# Altium footprint library pcb2D3D库101.PcbLib: 411 footprints (part 16 of 26)
Each footprint in its own frame and in the unit in brackets; x right, y up, seen from the top. Pads: shape width x height; smd on the part's side, far side on the other; paste and mask are expansions set on the pad; w line width, h text height; cw(c..) or ccw(c..) is an arc to the next point about the centre after c.
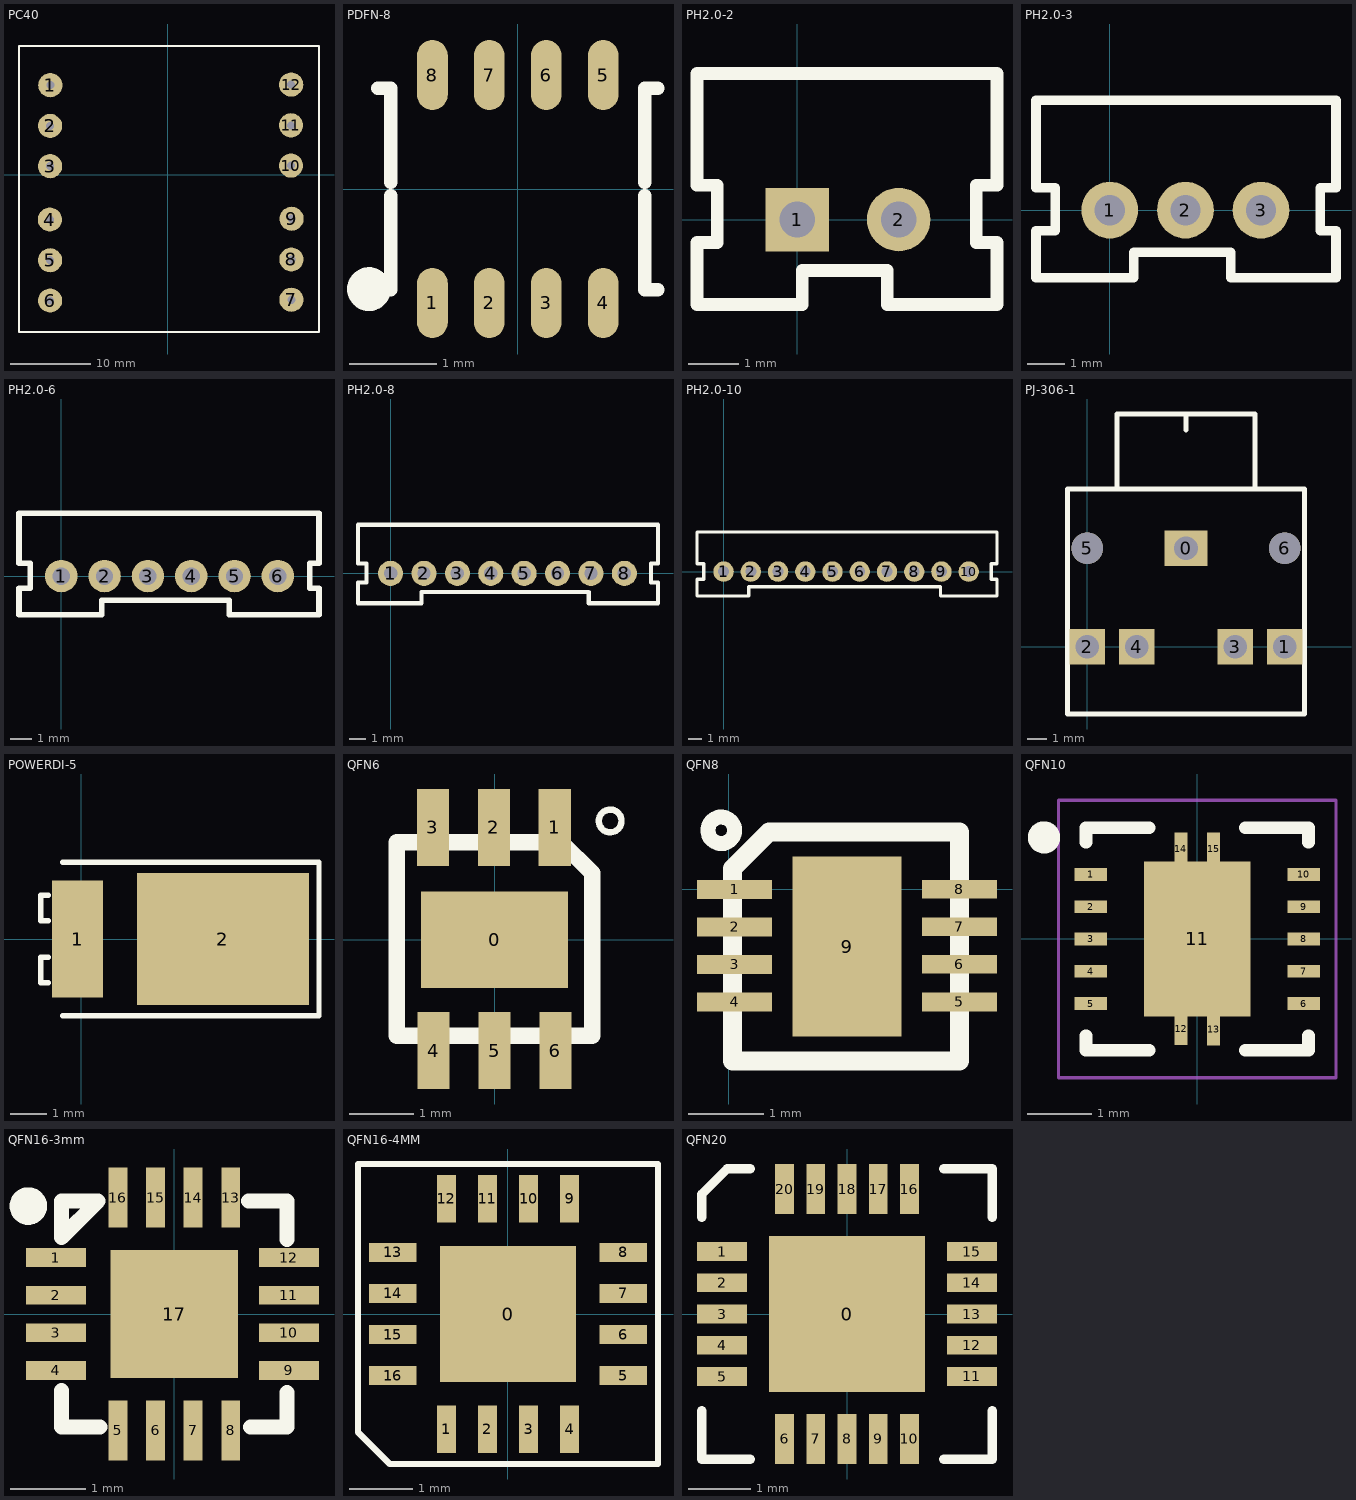
[diagram p15: the footprints below, top view; thin cyan lines are the x and y axes]

## PC40 [mm]
pads (12):
  round 3 hole 1: 1(-14.605,11.151) 2(-14.63,6.096) 3(-14.63,1.092) 4(-14.656,-5.537) 5(-14.63,-10.592) 6(-14.63,-15.596) 7(15.342,-15.494) 8(15.342,-10.49) 9(15.367,-5.436) 10(15.291,1.168) 11(15.291,6.172) 12(15.316,11.227)
TopOverlay:
  lines w0.254: -18.491,-19.482 -18.491,16.002 18.771,16.002 18.771,-19.482 -18.491,-19.482
3D body: height 15, standoff -5, extent 14.324,10.229 16.316,12.225
3D body: height 15, standoff -5, extent 14.299,5.174 16.291,7.17
3D body: height 15, standoff -5, extent 14.299,0.171 16.291,2.167
3D body: height 15, standoff -5, extent 14.375,-6.433 16.367,-4.437
3D body: height 15, standoff -5, extent 14.35,-11.488 16.342,-9.492
3D body: height 15, standoff -5, extent 14.35,-16.492 16.342,-14.496
3D body: height 15, standoff -5, extent -15.622,-16.593 -13.63,-14.597
3D body: height 15, standoff -5, extent -15.622,-11.59 -13.63,-9.594
3D body: height 15, standoff -5, extent -15.652,-6.477 -13.66,-4.481
3D body: height 15, standoff -5, extent -15.622,0.094 -13.63,2.09
3D body: height 15, standoff -5, extent -15.622,5.098 -13.63,7.094
3D body: height 15, standoff -5, extent -15.597,10.153 -13.605,12.149
3D body: height 30, standoff 5, extent -18.491,-19.482 18.771,16.002

## PCBComponent_1 - duplicate [mm]

## PDFN-8 [mm]
height 0.9
pads (8):
  oval 0.35x0.8 smd: 1(-0.975,-1.3) 2(-0.325,-1.3) 3(0.325,-1.3) 4(0.975,-1.3) 5(0.975,1.3) 6(0.325,1.3) 7(-0.325,1.3) 8(-0.975,1.3)
TopOverlay:
  circle w0.25: c-1.7,-1.143 r0.125
  lines w0.152: -1.6,1.15 -1.45,1.15 -1.45,0.075 ; -1.45,-1.15 -1.45,-0.075 ; 1.45,-0.075 1.45,-1.15 1.6,-1.15 ; 1.45,0.075 1.45,1.15 1.6,1.15
3D body "PDFN-8.STEP": height 0.9, standoff 0, extent -1.549,-1.4 1.551,1.4

## PH2.0-2 [mil]
pads (2):
  rect 50x50 hole 28: 1(0,0)
  round 50 hole 28: 2(80,0)
TopOverlay:
  lines w10: -78.8,-66.93 -78.8,-18.06 -62.82,-18.06 -62.82,26.94 -78.8,26.94 -78.8,115 157.42,115 157.42,26.94 141,26.94 141,-18.06 157.42,-18.06 157.42,-66.93 71,-66.93 71,-40.19 4,-40.19 4,-66.93 -78.8,-66.93
3D body "PH2.step": height 236.22, standoff -133.86, extent -76.13,-65.57 156.15,111.59

## PH2.0-3 [mm]
pads (3):
  round 1.5 hole 0.8: 1(0,0) 2(2,0) 3(4,0)
TopOverlay:
  lines w0.254: -1.952,-1.791 -1.952,-0.55 -1.444,-0.55 -1.444,0.593 -1.952,0.593 -1.952,2.909 5.983,2.909 5.983,0.593 5.566,0.593 5.566,-0.55 5.983,-0.55 5.983,-1.791 3.2,-1.791 3.2,-1.112 0.635,-1.112 0.635,-1.791 -1.952,-1.791
3D body "PH3.step": height 6, standoff -3.4, extent -1.943,-1.681 5.957,2.819

## PH2.0-6 [mm]
pads (6):
  round 1.5 hole 0.8: 1(0,0) 2(2,0) 3(4,0) 4(6,0) 5(8,0) 6(10,0)
TopOverlay:
  lines w0.254: -1.952,-1.791 -1.952,-0.55 -1.444,-0.55 -1.444,0.593 -1.952,0.593 -1.952,2.909 11.902,2.909 11.902,0.593 11.485,0.593 11.485,-0.55 11.902,-0.55 11.902,-1.791 7.751,-1.791 7.751,-1.112 3.509,-1.112 1.858,-1.112 1.858,-1.791 -1.952,-1.791
3D body "PH6.step": height 6, standoff -3, extent -1.946,-1.702 11.954,2.798

## PH2.0-8 [mm]
pads (8):
  round 1.5 hole 0.8: 1(0,0) 2(2,0) 3(4,0) 4(6,0) 5(8,0) 6(10,0) 7(12,0) 8(14,0)
TopOverlay:
  lines w0.254: -1.952,-1.791 1.858,-1.791 1.858,-1.112 3.509,-1.112 11.866,-1.112 11.866,-1.791 16.016,-1.791 16.016,-0.55 15.599,-0.55 15.599,0.593 16.016,0.593 16.016,2.909 -1.952,2.909 -1.952,0.593 -1.444,0.593 -1.444,-0.55 -1.952,-0.55 -1.952,-1.791
3D body "PH8.step": height 6, standoff -3, extent -1.94,-1.676 15.96,2.824

## PH2.0-10 [mm]
pads (10):
  round 1.5 hole 0.8: 1(0,0) 2(2,0) 3(4,0) 4(6,0) 5(8,0) 6(10,0) 7(12,0) 8(14,0) 9(16,0) 10(18,0)
TopOverlay:
  lines w0.254: -1.952,-1.791 1.858,-1.791 1.858,-1.112 3.509,-1.112 15.93,-1.112 15.93,-1.791 20.08,-1.791 20.08,-0.55 19.663,-0.55 19.663,0.593 20.08,0.593 20.08,2.909 -1.952,2.909 -1.952,0.593 -1.444,0.593 -1.444,-0.55 -1.952,-0.55 -1.952,-1.791
3D body "PH10.step": height 6, standoff -3, extent -1.952,-1.695 19.948,2.805

## PJ-306-1 [mm]
pads (7):
  rect 2.2x1.8 hole 1.2: 0(5,5)
  rect 1.8x1.8 hole 1.2: 1(10,0) 2(0,0) 3(7.5,0) 4(2.5,0)
  round 1.6 hole 1.6 unplated: 5(0,5) 6(10,5)
TopOverlay:
  lines w0.254: 1.5,8 1.5,11.8 8.4,11.8 ; 5,11 5,11.8 ; 8.5,8 8.5,11.8 ; -1,-3.4 11,-3.4 11,8 -1,8 -1,-3.4
3D body "耳机.ST": height 3.2, standoff -10.8, extent -1.041,-3.689 11.059,11.411

## POWERDI-5 [mm]
pads (2):
  rect 1.4x3.2 smd: 1(-0.1,0)
  rect 4.7x3.6 smd: 2(3.87,0)
TopOverlay:
  lines w0.15: -0.9,-1.2 -1.1,-1.2 -1.1,-0.5 -0.9,-0.5 ; -0.9,0.5 -1.1,0.5 -1.1,1.2 -0.9,1.2 ; -0.5,-2.1 6.5,-2.1 6.5,2.1 -0.5,2.1
3D body "POWERDI-5.STEP": height 1.17, standoff 0.02, extent -0.5,-2.025 6.1,2.025

## QFN6 [mm] "SOT-23/SC-74A; 5 Leads; Body 3.1 x 3 mm, inc. leads (LxW max)"
height 1.45
pads (7):
  rect 2.3x1.5 smd: 0(0,0)
  rect 0.5x1.2 smd: 1(0.94,1.753) 2(-0.01,1.753) 3(-0.96,1.753) 4(-0.95,-1.727) 5(0,-1.727) 6(0.95,-1.727)
TopOverlay:
  circle w0.1: c1.804,1.854 r0.177
  lines w0.254: -1.524,-1.499 -1.524,1.524 1.041,1.524 1.524,1.041 1.524,-1.499 -1.524,-1.499
3D body: height 1, standoff 0, extent -1.524,-1.499 1.524,1.524

## QFN8 [mm] "SOT-23/SC-74A; 5 Leads; Body 3.1 x 3 mm, inc. leads (LxW max)"
height 1.45
pads (9):
  rect 1x0.25 smd: 1(0.076,0) 2(0.076,-0.5) 3(0.076,-1) 5(3.073,-1.499) 6(3.073,-0.999) 7(3.073,-0.499) 8(3.073,0.001)
  rect 1x0.25 smd paste+0: 4(0.076,-1.5)
  rect 1.45x2.4 smd: 9(1.575,-0.762)
TopOverlay:
  circle w0.2: c-0.101,0.787 r0.177
  lines w0.254: 0.051,-2.286 3.073,-2.286 3.073,0.762 0.533,0.762 0.051,0.279 0.051,-2.286
3D body: height 1, standoff 0, extent 0.051,-2.286 3.073,0.762

## QFN10 [mm] "QFN, 14-Leads, Body 3.00x3.00mm, Pitch 0.50mm, Thermal Pad 1.63x2.40mm, IPC Medium Density"
height 1
pads (15):
  rect 0.5x0.2 smd: 1(-1.65,1) 2(-1.65,0.5) 3(-1.65,0) 4(-1.65,-0.5) 5(-1.65,-1) 6(1.65,-1) 7(1.65,-0.5) 8(1.65,0) 9(1.65,0.5) 10(1.65,1)
  rect 1.65x2.4 smd: 11(0,0)
  rect 0.2x0.5 smd: 12(-0.25,-1.392) 13(0.254,-1.397) 14(-0.254,1.397) 15(0.254,1.397)
TopOverlay:
  circle w0.25: c-2.375,1.575 r0.125
  lines w0.2: -1.725,-1.5 -1.725,-1.725 -0.75,-1.725 ; -1.725,1.5 -1.725,1.725 -0.75,1.725 ; 0.75,-1.725 1.725,-1.725 1.725,-1.5 ; 0.75,1.725 1.725,1.725 1.725,1.5
Mechanical15:
  lines w0.05: -2.15,-2.15 2.15,-2.15 2.15,2.15 -2.15,2.15 -2.15,-2.15
  lines w0.1: -0.5,0 0.5,0 ; 0,-0.5 0,0.5
3D body: height 1, standoff 0.05, extent -1.575,-1.575 1.575,1.575
3D body: height 0.2, standoff 0.05, extent 0.152,-1.6 0.33,-1.397
3D body: height 0.2, standoff 0.05, extent -0.343,-1.6 -0.165,-1.397
3D body: height 0.2, standoff 0.05, extent 0.152,1.397 0.33,1.6
3D body: height 0.2, standoff 0.05, extent -0.356,1.397 -0.178,1.6
3D body: height 0.2, standoff 0.05, extent 1.397,-1.092 1.6,-0.914
3D body: height 0.2, standoff 0.05, extent 1.397,-0.584 1.6,-0.406
3D body: height 0.2, standoff 0.05, extent 1.397,-0.076 1.6,0.102
3D body: height 0.2, standoff 0.05, extent 1.397,0.406 1.6,0.584
3D body: height 0.2, standoff 0.05, extent 1.397,0.914 1.6,1.092
3D body: height 0.2, standoff 0.05, extent -1.6,0.914 -1.397,1.092
3D body: height 0.2, standoff 0.05, extent -1.6,0.406 -1.397,0.584
3D body: height 0.2, standoff 0.05, extent -1.6,-0.102 -1.397,0.076
3D body: height 0.2, standoff 0.05, extent -1.6,-0.584 -1.397,-0.406
3D body: height 0.2, standoff 0.05, extent -1.6,-1.092 -1.397,-0.914

## QFN16-3mm [mm] "QFN, 16-Leads, Body 3.0x3.0mm (max), Pitch 0.50mm, IPC Low Density"
height 3
pads (17):
  rect 0.8x0.25 smd: 1(-1.575,0.75) 2(-1.575,0.25) 3(-1.575,-0.25) 4(-1.575,-0.75) 9(1.524,-0.75) 10(1.524,-0.25) 11(1.524,0.25) 12(1.524,0.75)
  rect 0.25x0.8 smd: 5(-0.75,-1.55) 6(-0.25,-1.55) 7(0.25,-1.55) 8(0.75,-1.55) 13(0.75,1.55) 14(0.25,1.55) 15(-0.25,1.55) 16(-0.75,1.55)
  rect 1.7x1.7 smd: 17(0,0)
TopOverlay:
  circle w0.25: c-1.941,1.436 r0.125
  lines w0.2: -1.5,-1.015 -1.5,-1.5 -0.989,-1.5 ; 0.989,1.5 1.5,1.5 1.5,0.989 ; 1.016,-1.5 1.5,-1.5 1.5,-1.041 ; -1.5,1.016 -1.016,1.5 -1.5,1.5 -1.5,1.016
3D body "QFN-16_3x3.STEP": height 0.9, standoff 0, extent -1.549,-1.521 1.493,1.521

## QFN16-4MM [mm] "LNA"
height 5.33
pads (17):
  rect 2.15x2.15 smd: 0(0,0)
  rect 0.3x0.75 smd: 1(-0.975,-1.825) 2(-0.325,-1.825) 3(0.325,-1.825) 4(0.975,-1.825) 9(0.975,1.825) 10(0.325,1.825) 11(-0.325,1.825) 12(-0.975,1.825)
  rect 0.75x0.3 smd: 5(1.825,-0.975) 6(1.825,-0.325) 7(1.825,0.325) 8(1.825,0.975) 13(-1.825,0.975) 14(-1.825,0.325) 15(-1.825,-0.325) 16(-1.825,-0.975)
TopOverlay:
  lines w0.1: -1.025,2.375 2.375,2.375 2.375,-2.375 -1.525,-2.375 -1.875,-2.375 -2.375,-1.875 -2.375,-1.425 -2.375,2.375 -0.4,2.375
3D body "QFN16.step": height 0.85, standoff 0, extent -2.001,-1.981 2.001,2.021

## QFN20 [mm]
pads (21):
  rect 2.5x2.5 smd: 0(0,0)
  rect 0.8x0.3 smd: 1(-2,1) 2(-2,0.5) 3(-2,0) 4(-2,-0.5) 5(-2,-1) 11(2,-1) 12(2,-0.5) 13(2,0) 14(2,0.5) 15(2,1)
  rect 0.3x0.8 smd: 6(-1,-2) 7(-0.5,-2) 8(0,-2) 9(0.5,-2) 10(1,-2) 16(1,2) 17(0.5,2) 18(0,2) 19(-0.5,2) 20(-1,2)
TopOverlay:
  lines w0.15: -2.325,-1.55 -2.325,-2.325 -1.55,-2.325 ; -2.325,1.55 -2.325,1.917 -1.917,2.325 -1.55,2.325 ; 1.55,-2.325 2.325,-2.325 2.325,-1.55 ; 1.55,2.325 2.325,2.325 2.325,1.55
3D body "QFN-20.STEP": height 0.62, standoff -0.08, extent -1.501,-1.5 1.499,1.5